# Altium schematic symbol library SCHLIB.SchLib: 2608 symbols (part 19 of 20) (continued)
## R-806K-0603 (continued)
RES SMD 806K OHM 1% 1/10W 0603; Manufacturer Part Number: CRCW0603806KFKEA; Manufacturer: Vishay Dale; Tolerance: 0.01; Power: 0.1W; Temperature Coefficient: ±100ppm/°C; Object  Type: Part; Design Item ID: R-806K-0603; Value: 806K; Composition: Thick Film; Features: Automotive AEC-Q200; Operating Temperature: -55°C ~ 155°C; Height - Seated (Max): 0.50mm; Category: Resistor
footprint R0603
pins: 1, 2

## R-806R-0402
designator R?, comment Package: 0402  (hidden comment: 806R)
RES 806 OHM 1% 1/16W 0402; Manufacturer Part Number: RC0402FR-07806RL; Manufacturer: YAGEO; Tolerance: 0.01; Power: 0.063W; Temperature Coefficient: ±100ppm/°C; Object  Type: Part; Design Item ID: R-806R-0402; Value: 806R; Composition: Thick Film; Features: Moisture Resistant; Operating Temperature: -55°C ~ 155°C; Height - Seated (Max): 0.40mm; Category: Resistor
footprint R0402
pins: 1, 2

## R-806R-0603
designator R?, comment Package: 0603  (hidden comment: 806R)
RES SMD 806 OHM 1% 1/10W 0603; Manufacturer Part Number: CRCW0603806RFKEA; Manufacturer: Vishay Dale; Tolerance: 0.01; Power: 0.1W; Temperature Coefficient: ±100ppm/°C; Object  Type: Part; Design Item ID: R-806R-0603; Value: 806R; Composition: Thick Film; Features: Automotive AEC-Q200; Operating Temperature: -55°C ~ 155°C; Height - Seated (Max): 0.50mm; Category: Resistor
footprint R0603
pins: 1, 2

## R-820K-0402
designator R?, comment Package: 0402  (hidden comment: 820K)
RES 820K OHM 1% 1/16W 0402; Manufacturer Part Number: RC0402FR-07820KL; Manufacturer: YAGEO; Tolerance: 0.01; Power: 0.063W; Temperature Coefficient: ±100ppm/°C; Object  Type: Part; Design Item ID: R-820K-0402; Composition: Thick Film; Features: Moisture Resistant; Operating Temperature: -55°C ~ 155°C; Height - Seated (Max): 0.40mm; Category: Resistor; Value: 820K
footprint R0402
pins: 1, 2

## R-820K-0603
designator R?, comment Package: 0603  (hidden comment: 820K)
RES SMD 820K OHM 1% 1/10W 0603; Manufacturer Part Number: CRCW0603820KFKEA; Manufacturer: Vishay Dale; Tolerance: 0.01; Power: 0.1W; Temperature Coefficient: ±100ppm/°C; Object  Type: Part; Design Item ID: R-820K-0603; Value: 820K; Composition: Thick Film; Features: Automotive AEC-Q200; Operating Temperature: -55°C ~ 155°C; Height - Seated (Max): 0.50mm; Category: Resistor
footprint R0603
pins: 1, 2

## R-820R-0402
designator R?, comment Package: 0402  (hidden comment: 820R)
RES 820 OHM 1% 1/16W 0402; Manufacturer Part Number: RC0402FR-07820RL; Manufacturer: YAGEO; Tolerance: 0.01; Power: 0.063W; Temperature Coefficient: ±100ppm/°C; Object  Type: Part; Design Item ID: R-820R-0402; Value: 820R; Composition: Thick Film; Features: Moisture Resistant; Operating Temperature: -55°C ~ 155°C; Height - Seated (Max): 0.40mm; Category: Resistor
footprint R0402
pins: 1, 2

## R-820R-0603
designator R?, comment Package: 0603  (hidden comment: 820R)
RES SMD 820 OHM 1% 1/10W 0603; Manufacturer Part Number: CRCW0603820RFKEA; Manufacturer: Vishay Dale; Tolerance: 0.01; Power: 0.1W; Temperature Coefficient: ±100ppm/°C; Object  Type: Part; Design Item ID: R-820R-0603; Value: 820R; Composition: Thick Film; Features: Automotive AEC-Q200; Operating Temperature: -55°C ~ 155°C; Height - Seated (Max): 0.50mm; Category: Resistor
footprint R0603
pins: 1, 2

## R-825K-0402
designator R?, comment Package: 0402  (hidden comment: 825K)
RES 825K OHM 1% 1/16W 0402; Manufacturer Part Number: RC0402FR-07825KL; Manufacturer: YAGEO; Tolerance: 0.01; Power: 0.063W; Temperature Coefficient: ±100ppm/°C; Object  Type: Part; Design Item ID: R-825K-0402; Value: 825K; Composition: Thick Film; Features: Moisture Resistant; Operating Temperature: -55°C ~ 155°C; Height - Seated (Max): 0.40mm; Category: Resistor
footprint R0402
pins: 1, 2

## R-825K-0603
designator R?, comment Package: 0603  (hidden comment: 825K)
RES SMD 825K OHM 1% 1/10W 0603; Manufacturer Part Number: CRCW0603825KFKEA; Manufacturer: Vishay Dale; Tolerance: 0.01; Power: 0.1W; Temperature Coefficient: ±100ppm/°C; Object  Type: Part; Design Item ID: R-825K-0603; Value: 825K; Composition: Thick Film; Features: Automotive AEC-Q200; Operating Temperature: -55°C ~ 155°C; Height - Seated (Max): 0.50mm; Category: Resistor
footprint R0603
pins: 1, 2

## R-825R-0402
designator R?, comment Package: 0402  (hidden comment: 825R)
RES 825 OHM 1% 1/16W 0402; Manufacturer Part Number: RC0402FR-07825RL; Manufacturer: YAGEO; Tolerance: 0.01; Power: 0.063W; Temperature Coefficient: ±100ppm/°C; Object  Type: Part; Design Item ID: R-825R-0402; Value: 825R; Composition: Thick Film; Features: Moisture Resistant; Operating Temperature: -55°C ~ 155°C; Height - Seated (Max): 0.40mm; Category: Resistor
footprint R0402
pins: 1, 2

## R-825R-0603
designator R?, comment Package: 0603  (hidden comment: 825R)
RES SMD 825 OHM 1% 1/10W 0603; Manufacturer Part Number: CRCW0603825RFKEA; Manufacturer: Vishay Dale; Tolerance: 0.01; Power: 0.1W; Temperature Coefficient: ±100ppm/°C; Object  Type: Part; Design Item ID: R-825R-0603; Value: 825R; Composition: Thick Film; Features: Automotive AEC-Q200; Operating Temperature: -55°C ~ 155°C; Height - Seated (Max): 0.50mm; Category: Resistor
footprint R0603
pins: 1, 2

## R-845K-0402
designator R?, comment Package: 0402  (hidden comment: 845K)
RES 845K OHM 1% 1/16W 0402; Manufacturer Part Number: RC0402FR-07845KL; Manufacturer: YAGEO; Tolerance: 0.01; Power: 0.063W; Temperature Coefficient: ±100ppm/°C; Object  Type: Part; Design Item ID: R-845K-0402; Value: 845K; Composition: Thick Film; Features: Moisture Resistant; Operating Temperature: -55°C ~ 155°C; Height - Seated (Max): 0.40mm; Category: Resistor
footprint R0402
pins: 1, 2

## R-845K-0603
designator R?, comment Package: 0603  (hidden comment: 845K)
RES SMD 845K OHM 1% 1/10W 0603; Manufacturer Part Number: CRCW0603845KFKEA; Manufacturer: Vishay Dale; Tolerance: 0.01; Power: 0.1W; Temperature Coefficient: ±100ppm/°C; Object  Type: Part; Design Item ID: R-845K-0603; Value: 845K; Composition: Thick Film; Features: Automotive AEC-Q200; Operating Temperature: -55°C ~ 155°C; Height - Seated (Max): 0.50mm; Category: Resistor
footprint R0603
pins: 1, 2

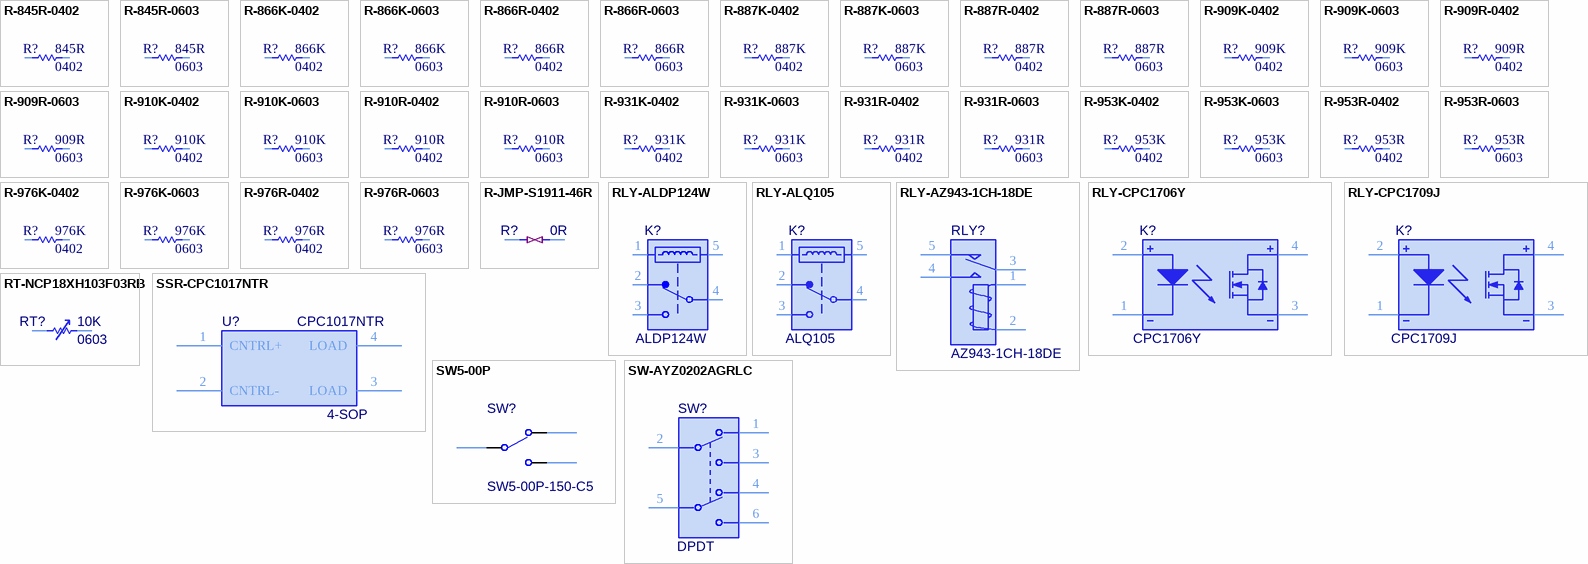
[diagram p81: symbols R-845R-0402 to SW-AYZ0202AGRLC]

## R-845R-0402
designator R?, comment Package: 0402  (hidden comment: 845R)
RES 845 OHM 1% 1/16W 0402; Manufacturer Part Number: RC0402FR-07845RL; Manufacturer: YAGEO; Tolerance: 0.01; Power: 0.063W; Temperature Coefficient: ±100ppm/°C; Object  Type: Part; Design Item ID: R-845R-0402; Value: 845R; Composition: Thick Film; Features: Moisture Resistant; Operating Temperature: -55°C ~ 155°C; Height - Seated (Max): 0.40mm; Category: Resistor
footprint R0402
pins: 1, 2

## R-845R-0603
designator R?, comment Package: 0603  (hidden comment: 845R)
RES SMD 845 OHM 1% 1/10W 0603; Manufacturer Part Number: CRCW0603845RFKEA; Manufacturer: Vishay Dale; Tolerance: 0.01; Power: 0.1W; Temperature Coefficient: ±100ppm/°C; Object  Type: Part; Design Item ID: R-845R-0603; Value: 845R; Composition: Thick Film; Features: Automotive AEC-Q200; Operating Temperature: -55°C ~ 155°C; Height - Seated (Max): 0.50mm; Category: Resistor
footprint R0603
pins: 1, 2

## R-866K-0402
designator R?, comment Package: 0402  (hidden comment: 866K)
RES 866K OHM 1% 1/16W 0402; Manufacturer Part Number: RC0402FR-07866KL; Manufacturer: YAGEO; Tolerance: 0.01; Power: 0.063W; Temperature Coefficient: ±100ppm/°C; Object  Type: Part; Design Item ID: R-866K-0402; Value: 866K; Composition: Thick Film; Features: Moisture Resistant; Operating Temperature: -55°C ~ 155°C; Height - Seated (Max): 0.40mm; Category: Resistor
footprint R0402
pins: 1, 2

## R-866K-0603
designator R?, comment Package: 0603  (hidden comment: 866K)
RES SMD 866K OHM 1% 1/10W 0603; Manufacturer Part Number: CRCW0603866KFKEA; Manufacturer: Vishay Dale; Tolerance: 0.01; Power: 0.1W; Temperature Coefficient: ±100ppm/°C; Object  Type: Part; Design Item ID: R-866K-0603; Value: 866K; Composition: Thick Film; Features: Automotive AEC-Q200; Operating Temperature: -55°C ~ 155°C; Height - Seated (Max): 0.50mm; Category: Resistor
footprint R0603
pins: 1, 2

## R-866R-0402
designator R?, comment Package: 0402  (hidden comment: 866R)
RES 866 OHM 1% 1/16W 0402; Manufacturer Part Number: RC0402FR-07866RL; Manufacturer: YAGEO; Tolerance: 0.01; Power: 0.063W; Temperature Coefficient: ±100ppm/°C; Object  Type: Part; Design Item ID: R-866R-0402; Value: 866R; Composition: Thick Film; Features: Moisture Resistant; Operating Temperature: -55°C ~ 155°C; Height - Seated (Max): 0.40mm; Category: Resistor
footprint R0402
pins: 1, 2

## R-866R-0603
designator R?, comment Package: 0603  (hidden comment: 866R)
RES SMD 866 OHM 1% 1/10W 0603; Manufacturer Part Number: CRCW0603866RFKEA; Manufacturer: Vishay Dale; Tolerance: 0.01; Power: 0.1W; Temperature Coefficient: ±100ppm/°C; Object  Type: Part; Design Item ID: R-866R-0603; Value: 866R; Composition: Thick Film; Features: Automotive AEC-Q200; Operating Temperature: -55°C ~ 155°C; Height - Seated (Max): 0.50mm; Category: Resistor
footprint R0603
pins: 1, 2

## R-887K-0402
designator R?, comment Package: 0402  (hidden comment: 887K)
RES 887K OHM 1% 1/16W 0402; Manufacturer Part Number: RC0402FR-07887KL; Manufacturer: YAGEO; Tolerance: 0.01; Power: 0.063W; Temperature Coefficient: ±100ppm/°C; Object  Type: Part; Design Item ID: R-887K-0402; Value: 887K; Composition: Thick Film; Features: Moisture Resistant; Operating Temperature: -55°C ~ 155°C; Height - Seated (Max): 0.40mm; Category: Resistor
footprint R0402
pins: 1, 2

## R-887K-0603
designator R?, comment Package: 0603  (hidden comment: 887K)
RES SMD 887K OHM 1% 1/10W 0603; Manufacturer Part Number: CRCW0603887KFKEA; Manufacturer: Vishay Dale; Tolerance: 0.01; Power: 0.1W; Temperature Coefficient: ±100ppm/°C; Object  Type: Part; Design Item ID: R-887K-0603; Value: 887K; Composition: Thick Film; Features: Automotive AEC-Q200; Operating Temperature: -55°C ~ 155°C; Height - Seated (Max): 0.50mm; Category: Resistor
footprint R0603
pins: 1, 2

## R-887R-0402
designator R?, comment Package: 0402  (hidden comment: 887R)
RES 887 OHM 1% 1/16W 0402; Manufacturer Part Number: RC0402FR-07887RL; Manufacturer: YAGEO; Tolerance: 0.01; Power: 0.063W; Temperature Coefficient: ±100ppm/°C; Object  Type: Part; Design Item ID: R-887R-0402; Composition: Thick Film; Features: Moisture Resistant; Operating Temperature: -55°C ~ 155°C; Height - Seated (Max): 0.40mm; Category: Resistor; Value: 887R
footprint R0402
pins: 1, 2

## R-887R-0603
designator R?, comment Package: 0603  (hidden comment: 887R)
RES SMD 887 OHM 1% 1/10W 0603; Manufacturer Part Number: CRCW0603887RFKEA; Manufacturer: Vishay Dale; Tolerance: 0.01; Power: 0.1W; Temperature Coefficient: ±100ppm/°C; Object  Type: Part; Design Item ID: R-887R-0603; Value: 887R; Composition: Thick Film; Features: Automotive AEC-Q200; Operating Temperature: -55°C ~ 155°C; Height - Seated (Max): 0.50mm; Category: Resistor
footprint R0603
pins: 1, 2

## R-909K-0402
designator R?, comment Package: 0402  (hidden comment: 909K)
RES 909K OHM 1% 1/16W 0402; Manufacturer Part Number: RC0402FR-07909KL; Manufacturer: YAGEO; Tolerance: 0.01; Power: 0.063W; Temperature Coefficient: ±100ppm/°C; Object  Type: Part; Design Item ID: R-909K-0402; Value: 909K; Composition: Thick Film; Features: Moisture Resistant; Operating Temperature: -55°C ~ 155°C; Height - Seated (Max): 0.40mm; Category: Resistor
footprint R0402
pins: 1, 2

## R-909K-0603
designator R?, comment Package: 0603  (hidden comment: 909K)
RES SMD 909K OHM 1% 1/10W 0603; Manufacturer Part Number: CRCW0603909KFKEA; Manufacturer: Vishay Dale; Tolerance: 0.01; Power: 0.1W; Temperature Coefficient: ±100ppm/°C; Object  Type: Part; Design Item ID: R-909K-0603; Value: 909K; Composition: Thick Film; Features: Automotive AEC-Q200; Operating Temperature: -55°C ~ 155°C; Height - Seated (Max): 0.50mm; Category: Resistor
footprint R0603
pins: 1, 2

## R-909R-0402
designator R?, comment Package: 0402  (hidden comment: 909R)
RES 909 OHM 1% 1/16W 0402; Manufacturer Part Number: RC0402FR-07909RL; Manufacturer: YAGEO; Tolerance: 0.01; Power: 0.063W; Temperature Coefficient: ±100ppm/°C; Object  Type: Part; Design Item ID: R-909R-0402; Value: 909R; Composition: Thick Film; Features: Moisture Resistant; Operating Temperature: -55°C ~ 155°C; Height - Seated (Max): 0.40mm; Category: Resistor
footprint R0402
pins: 1, 2

## R-909R-0603
designator R?, comment Package: 0603  (hidden comment: 909R)
RES SMD 909 OHM 1% 1/10W 0603; Manufacturer Part Number: CRCW0603909RFKEA; Manufacturer: Vishay Dale; Tolerance: 0.01; Power: 0.1W; Temperature Coefficient: ±100ppm/°C; Object  Type: Part; Design Item ID: R-909R-0603; Value: 909R; Composition: Thick Film; Features: Automotive AEC-Q200; Operating Temperature: -55°C ~ 155°C; Height - Seated (Max): 0.50mm; Category: Resistor
footprint R0603
pins: 1, 2

## R-910K-0402
designator R?, comment Package: 0402  (hidden comment: 910K)
RES 910K OHM 1% 1/16W 0402; Manufacturer Part Number: RC0402FR-07910KL; Manufacturer: YAGEO; Tolerance: 0.01; Power: 0.063W; Temperature Coefficient: ±100ppm/°C; Object  Type: Part; Design Item ID: R-910K-0402; Value: 910K; Composition: Thick Film; Features: Moisture Resistant; Operating Temperature: -55°C ~ 155°C; Height - Seated (Max): 0.40mm; Category: Resistor
footprint R0402
pins: 1, 2

## R-910K-0603
designator R?, comment Package: 0603  (hidden comment: 910K)
RES SMD 910K OHM 1% 1/10W 0603; Manufacturer Part Number: CRCW0603910KFKEA; Manufacturer: Vishay Dale; Tolerance: 0.01; Power: 0.1W; Temperature Coefficient: ±100ppm/°C; Object  Type: Part; Design Item ID: R-910K-0603; Composition: Thick Film; Features: Automotive AEC-Q200; Operating Temperature: -55°C ~ 155°C; Height - Seated (Max): 0.50mm; Category: Resistor; Value: 910K
footprint R0603
pins: 1, 2

## R-910R-0402
designator R?, comment Package: 0402  (hidden comment: 910R)
RES 910 OHM 1% 1/16W 0402; Manufacturer Part Number: RC0402FR-07910RL; Manufacturer: YAGEO; Tolerance: 0.01; Power: 0.063W; Temperature Coefficient: ±100ppm/°C; Object  Type: Part; Design Item ID: R-910R-0402; Value: 910R; Composition: Thick Film; Features: Moisture Resistant; Operating Temperature: -55°C ~ 155°C; Height - Seated (Max): 0.40mm; Category: Resistor
footprint R0402
pins: 1, 2

## R-910R-0603
designator R?, comment Package: 0603  (hidden comment: 910R)
RES SMD 910 OHM 1% 1/10W 0603; Manufacturer Part Number: CRCW0603910RFKEA; Manufacturer: Vishay Dale; Tolerance: 0.01; Power: 0.1W; Temperature Coefficient: ±100ppm/°C; Object  Type: Part; Design Item ID: R-910R-0603; Value: 910R; Composition: Thick Film; Features: Automotive AEC-Q200; Operating Temperature: -55°C ~ 155°C; Height - Seated (Max): 0.50mm; Category: Resistor
footprint R0603
pins: 1, 2

## R-931K-0402
designator R?, comment Package: 0402  (hidden comment: 931K)
RES 931K OHM 1% 1/16W 0402; Manufacturer Part Number: RC0402FR-07931KL; Manufacturer: YAGEO; Tolerance: 0.01; Power: 0.063W; Temperature Coefficient: ±100ppm/°C; Object  Type: Part; Design Item ID: R-931K-0402; Value: 931K; Composition: Thick Film; Features: Moisture Resistant; Operating Temperature: -55°C ~ 155°C; Height - Seated (Max): 0.40mm; Category: Resistor
footprint R0402
pins: 1, 2

## R-931K-0603
designator R?, comment Package: 0603  (hidden comment: 931K)
RES SMD 931K OHM 1% 1/10W 0603; Manufacturer Part Number: CRCW0603931KFKEA; Manufacturer: Vishay Dale; Tolerance: 0.01; Power: 0.1W; Temperature Coefficient: ±100ppm/°C; Object  Type: Part; Design Item ID: R-931K-0603; Value: 931K; Composition: Thick Film; Features: Automotive AEC-Q200; Operating Temperature: -55°C ~ 155°C; Height - Seated (Max): 0.50mm; Category: Resistor
footprint R0603
pins: 1, 2

## R-931R-0402
designator R?, comment Package: 0402  (hidden comment: 931R)
RES 931 OHM 1% 1/16W 0402; Manufacturer Part Number: RC0402FR-07931RL; Manufacturer: YAGEO; Tolerance: 0.01; Power: 0.063W; Temperature Coefficient: ±100ppm/°C; Object  Type: Part; Design Item ID: R-931R-0402; Value: 931R; Composition: Thick Film; Features: Moisture Resistant; Operating Temperature: -55°C ~ 155°C; Height - Seated (Max): 0.40mm; Category: Resistor
footprint R0402
pins: 1, 2

## R-931R-0603
designator R?, comment Package: 0603  (hidden comment: 931R)
RES SMD 931 OHM 1% 1/10W 0603; Manufacturer Part Number: CRCW0603931RFKEA; Manufacturer: Vishay Dale; Tolerance: 0.01; Temperature Coefficient: ±100ppm/°C; Object  Type: Part; Power: 0.1W; Design Item ID: R-931R-0603; Value: 931R; Composition: Thick Film; Features: Automotive AEC-Q200; Operating Temperature: -55°C ~ 155°C; Height - Seated (Max): 0.50mm; Category: Resistor
footprint R0603
pins: 1, 2

## R-953K-0402
designator R?, comment Package: 0402  (hidden comment: 953K)
RES 953K OHM 1% 1/16W 0402; Manufacturer Part Number: RC0402FR-07953KL; Manufacturer: YAGEO; Tolerance: 0.01; Power: 0.063W; Temperature Coefficient: ±100ppm/°C; Object  Type: Part; Design Item ID: R-953K-0402; Composition: Thick Film; Features: Moisture Resistant; Operating Temperature: -55°C ~ 155°C; Height - Seated (Max): 0.40mm; Category: Resistor; Value: 953K
footprint R0402
pins: 1, 2

## R-953K-0603
designator R?, comment Package: 0603  (hidden comment: 953K)
RES SMD 953K OHM 1% 1/10W 0603; Manufacturer Part Number: CRCW0603953KFKEA; Manufacturer: Vishay Dale; Tolerance: 0.01; Power: 0.1W; Temperature Coefficient: ±100ppm/°C; Object  Type: Part; Design Item ID: R-953K-0603; Value: 953K; Composition: Thick Film; Features: Automotive AEC-Q200; Operating Temperature: -55°C ~ 155°C; Height - Seated (Max): 0.50mm; Category: Resistor
footprint R0603
pins: 1, 2

## R-953R-0402
designator R?, comment Package: 0402  (hidden comment: 953R)
RES 953 OHM 1% 1/16W 0402; Manufacturer Part Number: RC0402FR-07953RL; Manufacturer: YAGEO; Tolerance: 0.01; Power: 0.063W; Temperature Coefficient: ±100ppm/°C; Object  Type: Part; Design Item ID: R-953R-0402; Value: 953R; Composition: Thick Film; Features: Moisture Resistant; Operating Temperature: -55°C ~ 155°C; Height - Seated (Max): 0.40mm; Category: Resistor
footprint R0402
pins: 1, 2

## R-953R-0603
designator R?, comment Package: 0603  (hidden comment: 953R)
RES SMD 953 OHM 1% 1/10W 0603; Manufacturer Part Number: CRCW0603953RFKEA; Manufacturer: Vishay Dale; Tolerance: 0.01; Temperature Coefficient: ±100ppm/°C; Object  Type: Part; Power: 0.1W; Design Item ID: R-953R-0603; Composition: Thick Film; Features: Automotive AEC-Q200; Operating Temperature: -55°C ~ 155°C; Height - Seated (Max): 0.50mm; Category: Resistor; Value: 953R
footprint R0603
pins: 1, 2

## R-976K-0402
designator R?, comment Package: 0402  (hidden comment: 976K)
RES 976K OHM 1% 1/16W 0402; Manufacturer Part Number: RC0402FR-07976KL; Manufacturer: YAGEO; Tolerance: 0.01; Temperature Coefficient: ±100ppm/°C; Object  Type: Part; Power: 0.063W; Design Item ID: R-976K-0402; Value: 976K; Composition: Thick Film; Features: Moisture Resistant; Operating Temperature: -55°C ~ 155°C; Height - Seated (Max): 0.40mm; Category: Resistor
footprint R0402
pins: 1, 2

## R-976K-0603
designator R?, comment Package: 0603  (hidden comment: 976K)
RES SMD 976K OHM 1% 1/10W 0603; Manufacturer Part Number: CRCW0603976KFKEA; Manufacturer: Vishay Dale; Tolerance: 0.01; Power: 0.1W; Temperature Coefficient: ±100ppm/°C; Object  Type: Part; Design Item ID: R-976K-0603; Value: 976K; Composition: Thick Film; Features: Automotive AEC-Q200; Operating Temperature: -55°C ~ 155°C; Height - Seated (Max): 0.50mm; Category: Resistor
footprint R0603
pins: 1, 2

## R-976R-0402
designator R?, comment Package: 0402  (hidden comment: 976R)
RES 976 OHM 1% 1/16W 0402; Manufacturer Part Number: RC0402FR-07976RL; Manufacturer: YAGEO; Tolerance: 0.01; Temperature Coefficient: ±100ppm/°C; Object  Type: Part; Power: 0.063W; Design Item ID: R-976R-0402; Composition: Thick Film; Features: Moisture Resistant; Operating Temperature: -55°C ~ 155°C; Height - Seated (Max): 0.40mm; Category: Resistor; Value: 976R
footprint R0402
pins: 1, 2

## R-976R-0603
designator R?, comment Package: 0603  (hidden comment: 976R)
RES SMD 976 OHM 1% 1/10W 0603; Manufacturer Part Number: CRCW0603976RFKEA; Manufacturer: Vishay Dale; Tolerance: 0.01; Temperature Coefficient: ±100ppm/°C; Object  Type: Part; Power: 0.1W; Design Item ID: R-976R-0603; Composition: Thick Film; Features: Automotive AEC-Q200; Operating Temperature: -55°C ~ 155°C; Height - Seated (Max): 0.50mm; Category: Resistor; Value: 976R
footprint R0603
pins: 1, 2

## R-JMP-S1911-46R
designator R?, comment 0R
JUMPER TIN SMD; Manufacturer: Harwin; Manufacturer Part Number: S1911-46R; Number of Positions: 2; Gender: Non-Gendered; Pitch: 0.119inch; Supplier 1: Digi-Key; Supplier Part Number 1: 952-1740-1-ND; Stock: 75482; Pricing: 1=0.28, 10=0.27, 25=0.2312, 50=0.1964, 100=0.1887, 250=0.1694, 500=0.1617, 1000=0.1348 (USD); RoHS: Yes; Color: Silver; Contact Material: Brass,Copper Alloy; Contact Plating: Tin; Material: Brass; Plating: Tin; Orientation: Straight; Number of Contacts: 2; Package Quantity: 4000; Packaging: Tape and Reel; Number of Rows: 1; Termination: SMD/SMT; Length: 6.85mm; Height: 0.038inch; Depth: 2.51mm; REACH SVHC: No SVHC; ComponentLink1URL: https://datasheet.ciiva.com/22627/1682347-22627073.pdf?src-supplier=Element14; ComponentLink1Description: https://datasheet.ciiva.com/22627/1682347-22627073.pdf?src-supplier=Element14; ComponentLink2URL: https://datasheet.ciiva.com/5224/s1911r-64735-5224691.pdf?src-supplier=Mouser; ComponentLink2Description: https://datasheet.ciiva.com/5224/s1911r-64735-5224691.pdf?src-supplier=Mouser; ComponentLink3URL: https://datasheet.ciiva.com/26852/getdatasheetpartid-716620-26852325.pdf?src-supplier=Verical; ComponentLink3Description: https://datasheet.ciiva.com/26852/getdatasheetpartid-716620-26852325.pdf?src-supplier=Verical; ComponentLink4URL: https://datasheet.ciiva.com/30493/0900766b81270b7b-30493566.pdf?src-supplier=RSComponents; ComponentLink4Description: https://datasheet.ciiva.com/30493/0900766b81270b7b-30493566.pdf?src-supplier=RSComponents; ComponentLink5URL: https://datasheet.ciiva.com/6783/s1911r-6783671.pdf?src-supplier=Digi-Key; ComponentLink5Description: https://datasheet.ciiva.com/6783/s1911r-6783671.pdf?src-supplier=Digi-Key
footprint R-JMP (Chip Resistor, 2-Leads, Body 6.85x2.00mm, IPC Medium Density)
pins: 1, 2

## RLY-ALDP124W
designator K?, comment ALDP124W
RELAY GEN PURPOSE SPST 5A 24V; Manufacturer: Panasonic; Voltage Rating (AC): 277V; Power Rating: 200mW; Coil Resistance: 2.88kR; Coil Current: 8.3mA; Operate Time: 10ms; Switching Capacity: 1.385kW; Relay Type: General Purpose; Coil Type: Non-Latching; Washability: OK; Supplier 1: Digi-Key; Manufacturer Part Number: ALDP124W; Stock 1: 7190; Pricing 1: 1=2,23000, 10=2,09300, 25=1,86000, 50=1,76700, 100=1,67400, 300=1,48800, 500=1,39500, 1000=1,30200, 5000=1,25550 (USD); RoHS: Yes; Number of Pins: 4; Contact Material: Silver; Contact Plating: Silver; Min Operating Temperature: -40°C; Max Operating Temperature: 85°C; Contact Current Rating: 5A; Package Quantity: 100; Packaging: Carton; Max Current Rating: 5A; Throw Configuration: SPST; Termination: PC Pin; Release Time: 10ms; Coil Power: 200mW; Max Voltage Rating (AC): 277V; Switching Current: 5A; Coil Voltage (DC): 24V; Length: 20.5mm; Depth: 7.2mm; Lead Free: Lead Free; ComponentLink1URL: https://datasheet.ciiva.com/18711/ds-61b10-en-ldp-18711613.pdf?src-supplier=Distrelec; ComponentLink1Description: https://datasheet.ciiva.com/18711/ds-61b10-en-ldp-18711613.pdf?src-supplier=Distrelec; Supplier Part Number 1: 255-3590-ND
footprint RLY-ALD-P105
pins: 1, 2 NC, 3 NO, 4 COM, 5

## RLY-ALQ105
designator K?, comment ALQ105
RELAY GEN PURPOSE SPDT 10A 5V; Manufacturer: Panasonic; Max Voltage Rating (AC): 250V; Power Rating: 400mW; Coil Resistance: 62.5R; Coil Current: 80mA; Operate Time: 20ms; Coil Type: Non-Latching; Relay Type: General Purpose; Washability: OK; ComponentLink1Description: Manufacturer URL; ComponentLink3Description: Package Specification; ComponentLink1URL: http://www3.panasonic.biz/ac/ae/index.jsp; ComponentLink3URL: http://www3.panasonic.biz/ac/e_download/control/relay/power/catalog/mech_eng_lq.pdf?f_cd=401220; ComponentLink2Description: Datasheet; ComponentLink2URL: http://www3.panasonic.biz/ac/e_download/control/relay/power/catalog/mech_eng_lq.pdf?f_cd=401220; Supplier 1: Digi-Key; Manufacturer Part Number: ALQ105; Stock 1: 17120; Pricing 1: 1=1.22000, 10=1.14800, 25=1.02000, 50=0.96900, 100=0.91800, 250=0.81600, 500=0.76500, 1000=0.71400, 5000=0.68850 (USD); RoHS: Yes; Number of Pins: 5; Weight: 7g; Contact Material: Silver; Min Operating Temperature: -40°C; Max Operating Temperature: 85°C; Contact Current Rating: 10A; Package Quantity: 100; Packaging: Carton; Voltage Rating (AC): 250V; Power Consumption: 400mW; Throw Configuration: SPDT; Termination: PC Pin; Release Time: 20ms; Coil Power: 400mW; Coil Voltage (DC): 5V; Length: 20mm; Height: 16mm; Depth: 10mm; Width: 10mm; REACH SVHC: Unknown; Lead Free: Lead Free; ComponentLink4URL: http://www.farnell.com/datasheets/1972641.pdf?src-supplier=Farnell; ComponentLink4Description: http://www.farnell.com/datasheets/1972641.pdf?src-supplier=Farnell; ComponentLink5URL: http://www.mouser.com/ds/2/315/lq-catalog-1075796.pdf?src-supplier=Mouser; ComponentLink5Description: http://www.mouser.com/ds/2/315/lq-catalog-1075796.pdf?src-supplier=Mouser; ComponentLink6URL: http://components.arrow.com/part/dataview/0323_06571492?src-supplier=Arrow+Europe; ComponentLink6Description: http://components.arrow.com/part/dataview/0323_06571492?src-supplier=Arrow+Europe; ComponentLink7URL: http://www.alliedelec.com/m/d/b3e6213128df2023f710f2e9cac83292.pdf?src-supplier=Allied+Electronics; ComponentLink7Description: http://www.alliedelec.com/m/d/b3e6213128df2023f710f2e9cac83292.pdf?src-supplier=Allied+Electronics; ComponentLink8URL: https://media.digikey.com/pdf/Data%20Sheets/Panasonic%20Electric%20Works%20PDFs/ALQ(LQ)Relays_NewProdIntro.pdf?src-supplier=Digi-Key; ComponentLink8Description: https://media.digikey.com/pdf/Data%20Sheets/Panasonic%20Electric%20Works%20PDFs/ALQ(LQ)Relays_NewProdIntro.pdf?src-supplier=Digi-Key; ComponentLink9URL: http://www.farnell.com/datasheets/1972641.pdf?src-supplier=Element14; ComponentLink9Description: http://www.farnell.com/datasheets/1972641.pdf?src-supplier=Element14
footprint PNSC-LQ-5-2000x1000x1600_V (LQ, 5-Leads, Body 20x10mm)
pins: 1, 2 NC, 3 NO, 4 COM, 5

## RLY-AZ943-1CH-18DE
designator RLY?, comment AZ943-1CH-18DE
15AMP Mini PC Board Relay 18VDC coil SPDT; Manufacturer: American Zettler; Coil Current: 20mA; Coil Resistance: 900R; Max Voltage Rating (AC): 300V; Max Voltage Rating (DC): 30V; Coil Voltage (DC): 18V; Washability: OK; Supplier 1: Electro Sonic; Manufacturer Part Number: AZ943-1CH-18DE; Stock 1: 365; Pricing 1: 35=0.8063, 50=0.6365 (USD); Mount: Through Hole; Number of Pins: 5; Min Operating Temperature: -40°C; Max Operating Temperature: 90°C; Throw Configuration: SPDT; Length: 19mm; Height: 15.7mm; Width: 15.3mm; ComponentLink1URL: http://www.onlinecomponents.com/productFiles/mf-AZ/az943.pdf?src-supplier=Onlinecomponents.com; ComponentLink1Description: http://www.onlinecomponents.com/productFiles/mf-AZ/az943.pdf?src-supplier=Onlinecomponents.com; ComponentLink2URL: http://www.produktinfo.conrad.com/datenblaetter/500000-524999/503613-da-01-en-RELAIS_ZETTLER_AZ943_1CH_18DE.pdf?src-supplier=Conrad; ComponentLink2Description: http://www.produktinfo.conrad.com/datenblaetter/500000-524999/503613-da-01-en-RELAIS_ZETTLER_AZ943_1CH_18DE.pdf?src-supplier=Conrad; Supplier Part Number 1: AZ9431CH18DE
footprint RLY-AZ943
pins: 1, 2, 3, 4, 5

## RLY-CPC1706Y
designator K?, comment CPC1706Y
SSR RELAY SPST-NO 4A 0-60V; Manufacturer: IXYS; Output Voltage: 60V; Input Current: 50mA; On-State Resistance: 90mR; Isolation Voltage: 2.5kV; Throw Configuration: SPST; Supplier 1: Digi-Key; Supplier Part Number 1: CPC1706Y-ND; Manufacturer Part Number: CPC1706Y; Stock: 300; Pricing: 1=3, 10=2.813, 25=2.5, 50=2.375, 100=2.25, 250=2, 500=1.875, 1000=1.75, 5000=1.6875 (USD); RoHS: Yes; Mount: Through Hole; Case/Package: SIP; Number of Pins: 4; Min Operating Temperature: -40°C; Max Operating Temperature: 85°C; Termination: PC Pin; Output Current: 4A; Load Current: 4A; Max Output Voltage: 60V; Relay Type: Relay; Package Quantity: 25; Packaging: Rail/Tube; Radiation Hardening: No; Lead Free: Lead Free; ComponentLink1URL: https://datasheet.ciiva.com/6569/cpc1706-6569415.pdf?src-supplier=Digi-Key; ComponentLink1Description: https://datasheet.ciiva.com/6569/cpc1706-6569415.pdf?src-supplier=Digi-Key
footprint RLY-4SIP
pins: 1 -, 2 +, 3 -, 4 +

## RLY-CPC1709J
designator K?, comment CPC1709J
SSR RELAY SPST-NO 9A 0-60V; Manufacturer: Ixys Clare; Throw Configuration: SPST; Output Current: 32A; Input Current: 50mA; Max Power Dissipation: 150mW; On-State Resistance: 50mR; Max Output Voltage: 60V; Max Input Current: 100mA; Isolation Voltage: 2.5kV; Max Input Voltage: 1.4V; Supplier 1: Digi-Key; Supplier Part Number 1: CLA280-ND; Manufacturer Part Number: CPC1709J; Stock: 1167; Pricing: 1=6.29, 10=5.895, 25=5.24, 50=4.978, 100=4.716, 250=4.192, 500=3.93, 1000=3.668, 5000=3.537 (USD); RoHS: Yes; Mount: Through Hole; Number of Pins: 4; Min Operating Temperature: -40°C; Max Operating Temperature: 85°C; Package Quantity: 25; Termination: PC Pin; Load Current: 9A; Packaging: Rail/Tube; Relay Type: Relay; Max Output Current: 32A; Radiation Hardening: No; Lead Free: Lead Free; ComponentLink1URL: https://datasheet.ciiva.com/15709/2cpc1709-15709048.pdf?src-supplier=Onlinecomponents.com; ComponentLink1Description: https://datasheet.ciiva.com/15709/2cpc1709-15709048.pdf?src-supplier=Onlinecomponents.com; ComponentLink2URL: https://datasheet.ciiva.com/2421/cpc1709-2421621.pdf?src-supplier=Digi-Key; ComponentLink2Description: https://datasheet.ciiva.com/2421/cpc1709-2421621.pdf?src-supplier=Digi-Key
footprint RLY-ISOPLUS264 (SIL, 4-Leads, Body 21x3.5mm)
pins: 1 -, 2 +, 3 -, 4 +

## RT-NCP18XH103F03RB
designator RT?, comment 10K  Case Code (Imperial): 0603
THERMISTOR 10K OHM NTC 0603 SMD; Manufacturer: Murata; Manufacturer Part Number: NCP18XH103F03RB; Resistance: 10kR; Tolerance: 1%; Power Rating: 100mW; Current Rating: 310uA; Accuracy: 0.7%; Temperature Coefficient: 100ppm/°C; Washability: OK; Dielectric: X7R; Voltage Rating: 100V; Capacitance: 100nF; Supplier 1: Digi-Key; Stock 1: 17485; Pricing 1: 1=0.23, 5=0.222, 10=0.198, 25=0.182, 50=0.1456, 100=0.1249, 500=0.10926, 1000=0.09365 (USD); Mount: Surface Mount; Case/Package: 0603; Number of Pins: 2; Case Code (Metric): 1608; Number of Terminals: 2; Min Operating Temperature: -40°C; Max Operating Temperature: 125°C; Packaging: Tape and Reel; Package Quantity: 1; Termination: SMD/SMT; Max Power Dissipation: 100mW; Length: 1.6mm; Height: 0.8mm; Depth: 0.8mm; Radiation Hardening: No; REACH SVHC: No SVHC; Lead Free: Lead Free; ComponentLink1URL: http://www.mouser.com/ds/2/281/r44e-522712.pdf; ComponentLink1Description: http://www.mouser.com/ds/2/281/r44e-522712.pdf; ComponentLink2URL: http://uk.rs-online.com/webdocs/07f1/0900766b807f1e39.pdf; ComponentLink2Description: http://uk.rs-online.com/webdocs/07f1/0900766b807f1e39.pdf; ComponentLink3URL: http://www.murata.com/~/media/webrenewal/support/library/catalog/products/thermistor/ntc/r44e.ashx; ComponentLink3Description: http://www.murata.com/~/media/webrenewal/support/library/catalog/products/thermistor/ntc/r44e.ashx; ComponentLink4URL: https://www.verical.com/server-webapp/html/getDatasheet?partID=153236; ComponentLink4Description: https://www.verical.com/server-webapp/html/getDatasheet?partID=153236; ComponentLink5URL: https://www.murata.com/~/media/webrenewal/support/library/catalog/products/thermistor/ntc/r44e.ashx?la=en-us; ComponentLink5Description: https://www.murata.com/~/media/webrenewal/support/library/catalog/products/thermistor/ntc/r44e.ashx?la=en-us; ComponentLink6URL: http://search.murata.co.jp/Ceramy/image/img/w_hinm/L0770E.pdf; ComponentLink6Description: http://search.murata.co.jp/Ceramy/image/img/w_hinm/L0770E.pdf; Supplier Part Number 1: 490-4800-6-ND; RoHS: Yes; Composition: Metal Foil; Number of Terminations: 2; Features: Automotive AEC-Q200; Width: 1.6mm; ComponentLink7URL: https://datasheet.ciiva.com/14981/krl-new-short-data-sheet-14981981.pdf?src-supplier=Digi-Key; ComponentLink7Description: https://datasheet.ciiva.com/14981/krl-new-short-data-sheet-14981981.pdf?src-supplier=Digi-Key; ComponentLink8URL: https://datasheet.ciiva.com/14981/krl-new-short-data-sheet-14981982.pdf?src-supplier=Digi-Key; ComponentLink8Description: https://datasheet.ciiva.com/14981/krl-new-short-data-sheet-14981982.pdf?src-supplier=Digi-Key; Stock: 963388; Pricing: 1=0.1, 10=0.054, 50=0.0294, 100=0.0239, 500=0.0171, 1000=0.0134 (USD); Thickness: 0.053inch; ComponentLink9URL: https://datasheet.ciiva.com/26936/getdatasheetpartid-781823-26936904.pdf?src-supplier=Verical; ComponentLink9Description: https://datasheet.ciiva.com/26936/getdatasheetpartid-781823-26936904.pdf?src-supplier=Verical
footprint R-0603
pins: 1, 2

## SSR-CPC1017NTR
designator U?, comment CPC1017NTR  Case/Package: 4-SOP
SSR RELAY SPST-NO 100MA 0-60V; Manufacturer: Ixys Clare; Output Voltage: 60V; Throw Configuration: SPST; Max Input Voltage: 1.4V; On-State Resistance: 16R; Max Power Dissipation: 400mW; Max Input Current: 50mA; Isolation Voltage: 1.5kV; Number of Channels: 1; Capacitance: 1pF; Turn-On Delay Time: 10ms; Washability: OK; Supplier 1: Digi-Key; Manufacturer Part Number: CPC1017NTR; Stock 1: 25719; Pricing 1: 1=0,79000, 10=0,74300, 25=0,66000, 50=0,62700, 100=0,59400, 250=0,52800, 500=0,49500, 1000=0,46200 (USD); RoHS: Yes; Mount: Surface Mount; Number of Pins: 4; Min Operating Temperature: -40°C; Max Operating Temperature: 85°C; Output Current: 100mA; Packaging: Tape and Reel; Max Output Current: 100mA; Package Quantity: 2000; Load Current: 100mA; Termination: Gull Wing; Max Output Voltage: 60V; Input Current: 50mA; Relay Type: Relay; Turn-Off Delay Time: 10ms; Length: 4.089mm; Height: 2.184mm; Width: 3.8mm; Radiation Hardening: No; ComponentLink1URL: https://datasheet.ciiva.com/2421/cpc1017n-2421248.pdf?src-supplier=Digi-Key; ComponentLink1Description: https://datasheet.ciiva.com/2421/cpc1017n-2421248.pdf?src-supplier=Digi-Key; ComponentLink2URL: https://datasheet.ciiva.com/2421/cpc1017n-2421249.pdf?src-supplier=Digi-Key; ComponentLink2Description: https://datasheet.ciiva.com/2421/cpc1017n-2421249.pdf?src-supplier=Digi-Key; ComponentLink3URL: https://datasheet.ciiva.com/4469/cpc1017n-16278-4469629.pdf?src-supplier=Mouser; ComponentLink3Description: https://datasheet.ciiva.com/4469/cpc1017n-16278-4469629.pdf?src-supplier=Mouser; ComponentLink4URL: https://datasheet.ciiva.com/2421/cpc1017n-2421247.pdf?src-supplier=Digi-Key; ComponentLink4Description: https://datasheet.ciiva.com/2421/cpc1017n-2421247.pdf?src-supplier=Digi-Key; Supplier Part Number 1: CLA233CT-ND
footprint SOP_4
pins: 1 CNTRL+, 2 CNTRL-, 3 LOAD, 4 LOAD

## SW5-00P
designator SW?, comment SW5-00P-150-C5
SWITCH SNAP ACTION SPDT 5A 250V; Washability: OK
footprint SW5-00P (SW5-00P-150-C5  SWITCH SNAP ACTION SPDT 5A 250V)
pins: C COM, NC, NO

## SW-AYZ0202AGRLC
designator SW?, comment DPDT